# Altium footprint library BBC_Connectors.PcbLib: 141 footprints (part 6 of 9)
Each footprint in its own frame and in the unit in brackets; x right, y up, seen from the top. Pads: shape width x height; smd on the part's side, far side on the other; paste and mask are expansions set on the pad; w line width, h text height; cw(c..) or ccw(c..) is an arc to the next point about the centre after c.
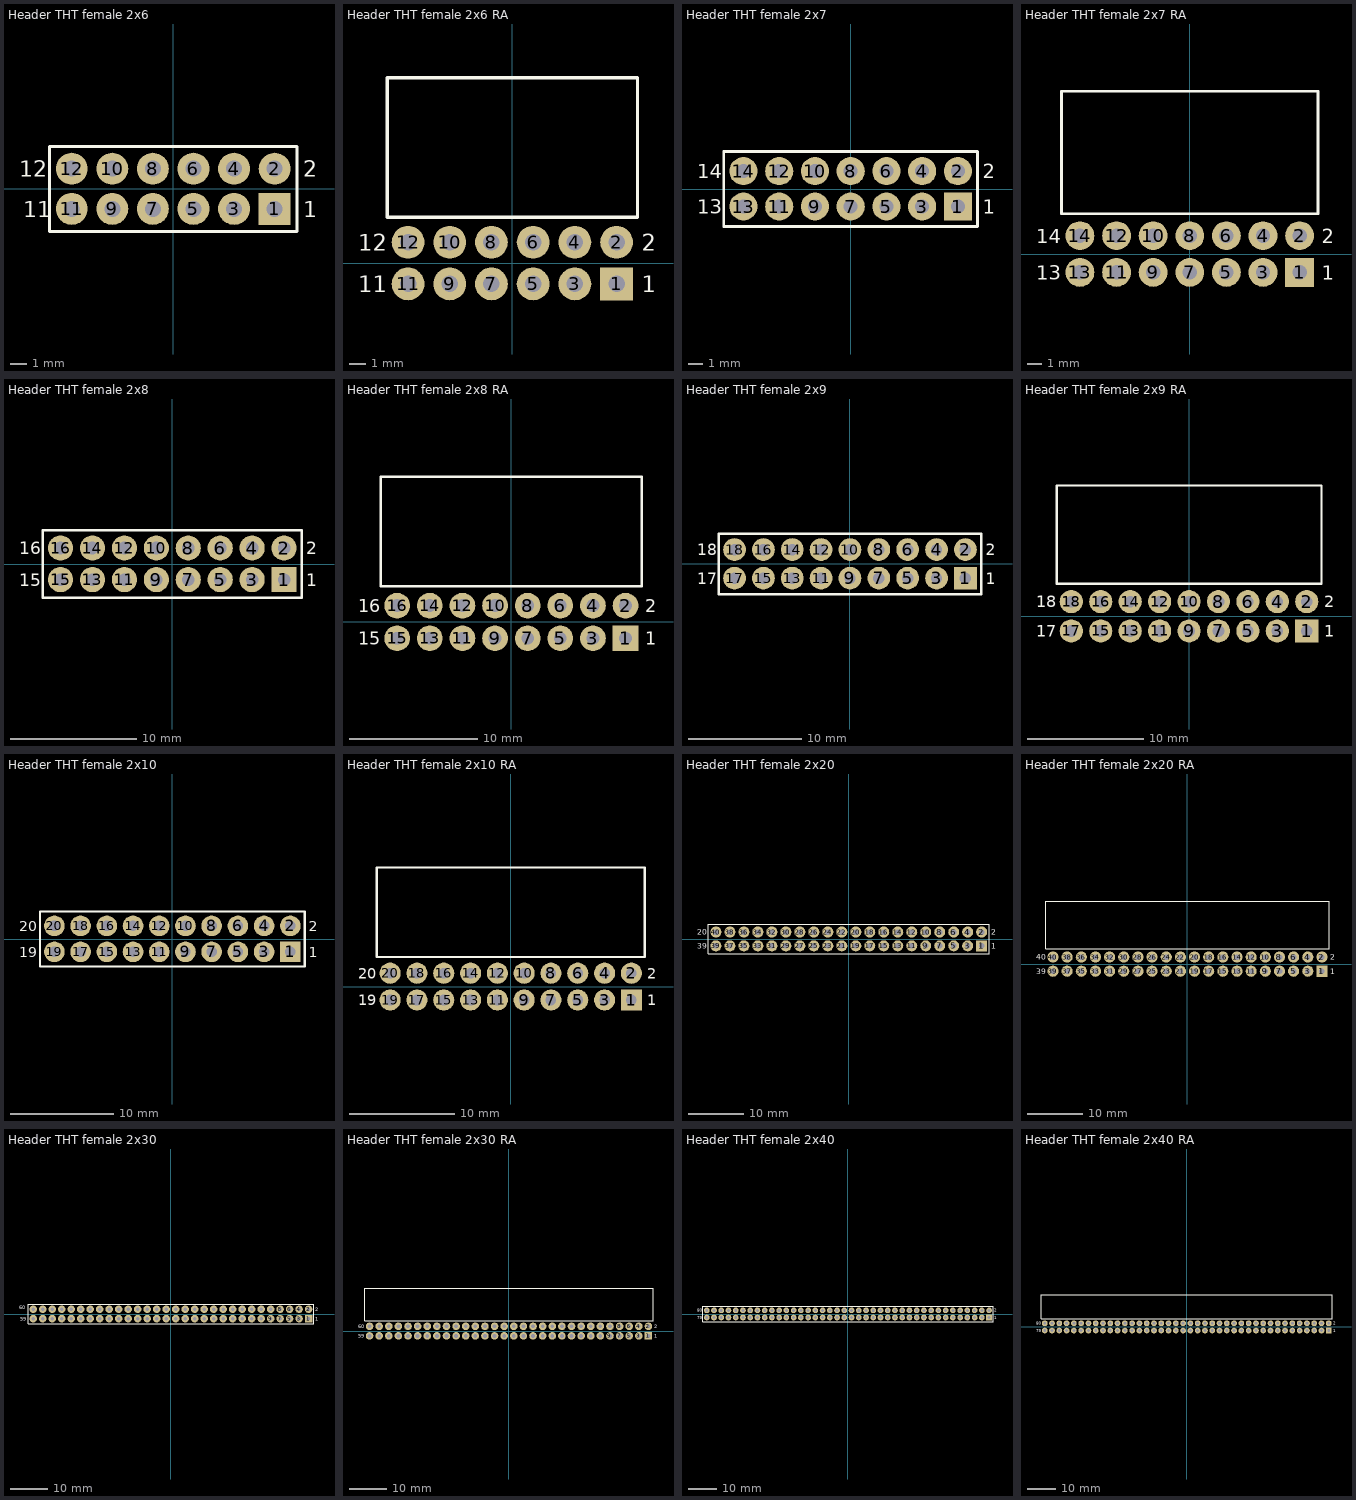
[diagram p5: the footprints below, top view; thin cyan lines are the x and y axes]

## Header THT female 2x6 [mm] "header for tht mounting / pitch = 2.54mm"
height 11
pads (12):
  rect 2x2 hole 1: 1(6.35,-1.245)
  round 2 hole 1: 2(6.35,1.27) 3(3.81,-1.245) 4(3.81,1.27) 5(1.27,-1.245) 6(1.27,1.27) 7(-1.27,-1.245) 8(-1.27,1.27) 9(-3.81,-1.245) 10(-3.81,1.27) 11(-6.35,-1.245) 12(-6.35,1.27)
Top Overlay:
  lines w0.2: -7.747,-2.667 -7.747,2.667 7.747,2.667 7.747,-2.667 -7.747,-2.667
  text "11" at -9.398,-1.77 h1
  text "1" at 8.128,-1.77 h1
  text "2" at 8.128,0.77 h1
  text "12" at -9.652,0.77 h1
3D body "Header THT female 2x6.step": height 8.5, standoff -3.2, extent -7.62,-2.54 7.62,2.54
3D body: height 2.51, standoff -3, extent 2.54,3.81 2.54,3.81

## Header THT female 2x6 RA [mm] "right angled header for tht mounting / pitch = 2.54mm"
height 6
pads (12):
  rect 2x2 hole 1: 1(6.35,-1.27)
  round 2 hole 1: 2(6.35,1.27) 3(3.81,-1.27) 4(3.81,1.27) 5(1.27,-1.27) 6(1.27,1.27) 7(-1.27,-1.27) 8(-1.27,1.27) 9(-3.81,-1.27) 10(-3.81,1.27) 11(-6.35,-1.27) 12(-6.35,1.27)
Top Overlay:
  lines w0.2: -7.62,2.794 -7.62,11.294 7.62,11.294 7.62,2.794 -7.62,2.794
  text "12" at -9.398,0.762 h1
  text "11" at -9.398,-1.778 h1
  text "2" at 7.874,0.762 h1
  text "1" at 7.874,-1.778 h1
3D body: height 2.51, standoff -3, extent 2.54,3.81 2.54,3.81
3D body "Header THT female 2x6 RA.step": height 4.94, standoff -3.2, extent -7.62,-1.596 7.62,11.294

## Header THT female 2x7 [mm] "header for tht mounting / pitch = 2.54mm"
height 11
pads (14):
  rect 2x2 hole 1: 1(7.62,-1.245)
  round 2 hole 1: 2(7.62,1.27) 3(5.08,-1.245) 4(5.08,1.27) 5(2.54,-1.245) 6(2.54,1.27) 7(0,-1.245) 8(0,1.27) 9(-2.54,-1.245) 10(-2.54,1.27) 11(-5.08,-1.245) 12(-5.08,1.27) 13(-7.62,-1.245) 14(-7.62,1.27)
Top Overlay:
  lines w0.2: -9.017,-2.667 9.017,-2.667 9.017,2.667 -9.017,2.667 -9.017,-2.667
  text "14" at -10.922,0.77 h1
  text "2" at 9.398,0.77 h1
  text "1" at 9.398,-1.77 h1
  text "13" at -10.922,-1.77 h1
3D body: height 2.51, standoff -3, extent 2.54,3.81 2.54,3.81
3D body "Header THT female 2x7.step": height 8.5, standoff -3.2, extent -8.89,-2.54 8.89,2.54

## Header THT female 2x7 RA [mm] "right angled header for tht mounting / pitch = 2.54mm"
height 6
pads (14):
  rect 2x2 hole 1: 1(7.62,-1.27)
  round 2 hole 1: 2(7.62,1.27) 3(5.08,-1.27) 4(5.08,1.27) 5(2.54,-1.27) 6(2.54,1.27) 7(0,-1.27) 8(0,1.27) 9(-2.54,-1.27) 10(-2.54,1.27) 11(-5.08,-1.27) 12(-5.08,1.27) 13(-7.62,-1.27) 14(-7.62,1.27)
Top Overlay:
  lines w0.2: -8.89,2.794 8.89,2.794 8.89,11.294 -8.89,11.294 -8.89,2.794
  text "13" at -10.668,-1.778 h1
  text "14" at -10.668,0.762 h1
  text "1" at 9.144,-1.778 h1
  text "2" at 9.144,0.762 h1
3D body "Header THT female 2x7 RA.step": height 4.94, standoff -3.2, extent -8.89,-1.596 8.89,11.294
3D body: height 2.51, standoff -3, extent 2.54,3.81 2.54,3.81

## Header THT female 2x8 [mm] "header for tht mounting / pitch = 2.54mm"
height 11
pads (16):
  rect 2x2 hole 1: 1(8.89,-1.245)
  round 2 hole 1: 2(8.89,1.27) 3(6.35,-1.245) 4(6.35,1.27) 5(3.81,-1.245) 6(3.81,1.27) 7(1.27,-1.245) 8(1.27,1.27) 9(-1.27,-1.245) 10(-1.27,1.27) 11(-3.81,-1.245) 12(-3.81,1.27) 13(-6.35,-1.245) 14(-6.35,1.27) 15(-8.89,-1.245) 16(-8.89,1.27)
Top Overlay:
  lines w0.2: -10.287,-2.667 10.287,-2.667 10.287,2.667 -10.287,2.667 -10.287,-2.667
  text "16" at -12.192,0.77 h1
  text "2" at 10.668,0.77 h1
  text "1" at 10.668,-1.77 h1
  text "15" at -12.192,-1.77 h1
3D body: height 2.51, standoff -3, extent 2.54,3.81 2.54,3.81
3D body "Header THT female 2x8.step": height 8.5, standoff -3.2, extent -10.16,-2.54 10.16,2.54

## Header THT female 2x8 RA [mm] "right angled header for tht mounting / pitch = 2.54mm"
height 6
pads (16):
  rect 2x2 hole 1: 1(8.89,-1.27)
  round 2 hole 1: 2(8.89,1.27) 3(6.35,-1.27) 4(6.35,1.27) 5(3.81,-1.27) 6(3.81,1.27) 7(1.27,-1.27) 8(1.27,1.27) 9(-1.27,-1.27) 10(-1.27,1.27) 11(-3.81,-1.27) 12(-3.81,1.27) 13(-6.35,-1.27) 14(-6.35,1.27) 15(-8.89,-1.27) 16(-8.89,1.27)
Top Overlay:
  lines w0.2: -10.16,2.794 10.16,2.794 10.16,11.294 -10.16,11.294 -10.16,2.794
  text "1" at 10.414,-1.778 h1
  text "2" at 10.414,0.762 h1
  text "15" at -11.938,-1.778 h1
  text "16" at -11.938,0.762 h1
3D body "Header THT female 2x8 RA.step": height 4.94, standoff -3.2, extent -10.16,-1.596 10.16,11.294
3D body: height 2.51, standoff -3, extent 2.54,3.81 2.54,3.81

## Header THT female 2x9 [mm] "header for tht mounting / pitch = 2.54mm"
height 11
pads (18):
  rect 2x2 hole 1: 1(10.16,-1.245)
  round 2 hole 1: 2(10.16,1.27) 3(7.62,-1.245) 4(7.62,1.27) 5(5.08,-1.245) 6(5.08,1.27) 7(2.54,-1.245) 8(2.54,1.27) 9(0,-1.245) 10(0,1.27) 11(-2.54,-1.245) 12(-2.54,1.27) 13(-5.08,-1.245) 14(-5.08,1.27) 15(-7.62,-1.245) 16(-7.62,1.27) 17(-10.16,-1.245) 18(-10.16,1.27)
Top Overlay:
  lines w0.2: -11.557,-2.667 -11.557,2.667 11.557,2.667 11.557,-2.667 -11.557,-2.667
  text "17" at -13.462,-1.77 h1
  text "1" at 11.938,-1.77 h1
  text "2" at 11.938,0.77 h1
  text "18" at -13.462,0.77 h1
3D body "Header THT female 2x9.step": height 8.5, standoff -3.2, extent -11.43,-2.54 11.43,2.54
3D body: height 2.51, standoff -3, extent 2.54,3.81 2.54,3.81

## Header THT female 2x9 RA [mm] "right angled header for tht mounting / pitch = 2.54mm"
height 6
pads (18):
  rect 2x2 hole 1: 1(10.16,-1.27)
  round 2 hole 1: 2(10.16,1.27) 3(7.62,-1.27) 4(7.62,1.27) 5(5.08,-1.27) 6(5.08,1.27) 7(2.54,-1.27) 8(2.54,1.27) 9(0,-1.27) 10(0,1.27) 11(-2.54,-1.27) 12(-2.54,1.27) 13(-5.08,-1.27) 14(-5.08,1.27) 15(-7.62,-1.27) 16(-7.62,1.27) 17(-10.16,-1.27) 18(-10.16,1.27)
Top Overlay:
  lines w0.2: -11.43,2.794 -11.43,11.294 11.43,11.294 11.43,2.794 -11.43,2.794
  text "2" at 11.684,0.762 h1
  text "1" at 11.684,-1.778 h1
  text "18" at -13.208,0.762 h1
  text "17" at -13.208,-1.778 h1
3D body "Header THT female 2x9 RA.step": height 4.94, standoff -3.2, extent -11.43,-1.596 11.43,11.294
3D body: height 2.51, standoff -3, extent 2.54,3.81 2.54,3.81

## Header THT female 2x10 [mm] "header for tht mounting / pitch = 2.54mm"
height 11
pads (20):
  rect 2x2 hole 1: 1(11.43,-1.245)
  round 2 hole 1: 2(11.43,1.27) 3(8.89,-1.245) 4(8.89,1.27) 5(6.35,-1.245) 6(6.35,1.27) 7(3.81,-1.245) 8(3.81,1.27) 9(1.27,-1.245) 10(1.27,1.27) 11(-1.27,-1.245) 12(-1.27,1.27) 13(-3.81,-1.245) 14(-3.81,1.27) 15(-6.35,-1.245) 16(-6.35,1.27) 17(-8.89,-1.245) 18(-8.89,1.27) 19(-11.43,-1.245) 20(-11.43,1.27)
Top Overlay:
  lines w0.2: -12.827,-2.667 12.827,-2.667 12.827,2.667 -12.827,2.667 -12.827,-2.667
  text "19" at -14.859,-1.77 h1
  text "1" at 13.208,-1.77 h1
  text "2" at 13.208,0.77 h1
  text "20" at -14.859,0.77 h1
3D body: height 2.51, standoff -3, extent 2.54,3.81 2.54,3.81
3D body "Header THT female 2x10.step": height 8.5, standoff -3.2, extent -12.7,-2.54 12.7,2.54

## Header THT female 2x10 RA [mm] "right angled header for tht mounting / pitch = 2.54mm"
height 6
pads (20):
  rect 2x2 hole 1: 1(11.43,-1.27)
  round 2 hole 1: 2(11.43,1.27) 3(8.89,-1.27) 4(8.89,1.27) 5(6.35,-1.27) 6(6.35,1.27) 7(3.81,-1.27) 8(3.81,1.27) 9(1.27,-1.27) 10(1.27,1.27) 11(-1.27,-1.27) 12(-1.27,1.27) 13(-3.81,-1.27) 14(-3.81,1.27) 15(-6.35,-1.27) 16(-6.35,1.27) 17(-8.89,-1.27) 18(-8.89,1.27) 19(-11.43,-1.27) 20(-11.43,1.27)
Top Overlay:
  lines w0.2: -12.7,2.794 -12.7,11.294 12.7,11.294 12.7,2.794 -12.7,2.794
  text "20" at -14.478,0.762 h1
  text "19" at -14.478,-1.778 h1
  text "2" at 12.954,0.762 h1
  text "1" at 12.954,-1.778 h1
3D body "Header THT female 2x10 RA.step": height 4.94, standoff -3.2, extent -12.7,-1.596 12.7,11.294
3D body: height 2.51, standoff -3, extent 2.54,3.81 2.54,3.81

## Header THT female 2x20 [mm] "header for tht mounting / pitch = 2.54mm"
height 11
pads (40):
  rect 2x2 hole 1: 1(24.13,-1.245)
  round 2 hole 1: 2(24.13,1.27) 3(21.59,-1.245) 4(21.59,1.27) 5(19.05,-1.245) 6(19.05,1.27) 7(16.51,-1.245) 8(16.51,1.27) 9(13.97,-1.245) 10(13.97,1.27) 11(11.43,-1.245) 12(11.43,1.27) 13(8.89,-1.245) 14(8.89,1.27) 15(6.35,-1.245) 16(6.35,1.27) 17(3.81,-1.245) 18(3.81,1.27) 19(1.27,-1.245) 20(1.27,1.27) 21(-1.27,-1.245) 22(-1.27,1.27) 23(-3.81,-1.245) 24(-3.81,1.27) 25(-6.35,-1.245) 26(-6.35,1.27) 27(-8.89,-1.245) 28(-8.89,1.27) 29(-11.43,-1.245) 30(-11.43,1.27) 31(-13.97,-1.245) 32(-13.97,1.27) 33(-16.51,-1.245) 34(-16.51,1.27) 35(-19.05,-1.245) 36(-19.05,1.27) 37(-21.59,-1.245) 38(-21.59,1.27) 39(-24.13,-1.245) 40(-24.13,1.27)
Top Overlay:
  lines w0.2: -25.527,-2.667 25.527,-2.667 25.527,2.667 -25.527,2.667 -25.527,-2.667
  text "20" at -27.559,0.77 h1
  text "2" at 25.908,0.77 h1
  text "1" at 25.908,-1.77 h1
  text "39" at -27.559,-1.77 h1
3D body "Header THT female 2x20.step": height 8.5, standoff -3.2, extent -25.4,-2.54 25.4,2.54
3D body: height 2.51, standoff -3, extent 2.54,3.81 2.54,3.81

## Header THT female 2x20 RA [mm] "right angled header for tht mounting / pitch = 2.54mm"
height 6
pads (40):
  rect 2x2 hole 1: 1(24.13,-1.27)
  round 2 hole 1: 2(24.13,1.27) 3(21.59,-1.27) 4(21.59,1.27) 5(19.05,-1.27) 6(19.05,1.27) 7(16.51,-1.27) 8(16.51,1.27) 9(13.97,-1.27) 10(13.97,1.27) 11(11.43,-1.27) 12(11.43,1.27) 13(8.89,-1.27) 14(8.89,1.27) 15(6.35,-1.27) 16(6.35,1.27) 17(3.81,-1.27) 18(3.81,1.27) 19(1.27,-1.27) 20(1.27,1.27) 21(-1.27,-1.27) 22(-1.27,1.27) 23(-3.81,-1.27) 24(-3.81,1.27) 25(-6.35,-1.27) 26(-6.35,1.27) 27(-8.89,-1.27) 28(-8.89,1.27) 29(-11.43,-1.27) 30(-11.43,1.27) 31(-13.97,-1.27) 32(-13.97,1.27) 33(-16.51,-1.27) 34(-16.51,1.27) 35(-19.05,-1.27) 36(-19.05,1.27) 37(-21.59,-1.27) 38(-21.59,1.27) 39(-24.13,-1.27) 40(-24.13,1.27)
Top Overlay:
  lines w0.2: -25.4,2.794 -25.4,11.294 25.4,11.294 25.4,2.794 -25.4,2.794
  text "40" at -27.178,0.762 h1
  text "39" at -27.178,-1.778 h1
  text "2" at 25.654,0.762 h1
  text "1" at 25.654,-1.778 h1
3D body: height 2.51, standoff -3, extent 2.54,3.81 2.54,3.81
3D body "Header THT female 2x20 RA.step": height 4.94, standoff -3.2, extent -25.4,-1.596 25.4,11.294

## Header THT female 2x30 [mm] "header for tht mounting / pitch = 2.54mm"
height 11
pads (60):
  rect 2x2 hole 1: 1(36.83,-1.245)
  round 2 hole 1: 2(36.83,1.27) 3(34.29,-1.245) 4(34.29,1.27) 5(31.75,-1.245) 6(31.75,1.27) 7(29.21,-1.245) 8(29.21,1.27) 9(26.67,-1.245) 10(26.67,1.27) 11(24.13,-1.245) 12(24.13,1.27) 13(21.59,-1.245) 14(21.59,1.27) 15(19.05,-1.245) 16(19.05,1.27) 17(16.51,-1.245) 18(16.51,1.27) 19(13.97,-1.245) 20(13.97,1.27) 21(11.43,-1.245) 22(11.43,1.27) 23(8.89,-1.245) 24(8.89,1.27) 25(6.35,-1.245) 26(6.35,1.27) 27(3.81,-1.245) 28(3.81,1.27) 29(1.27,-1.245) 30(1.27,1.27) 31(-1.27,-1.245) 32(-1.27,1.27) 33(-3.81,-1.245) 34(-3.81,1.27) 35(-6.35,-1.245) 36(-6.35,1.27) 37(-8.89,-1.245) 38(-8.89,1.27) 39(-11.43,-1.245) 40(-11.43,1.27) 41(-13.97,-1.245) 42(-13.97,1.27) 43(-16.51,-1.245) 44(-16.51,1.27) 45(-19.05,-1.245) 46(-19.05,1.27) 47(-21.59,-1.245) 48(-21.59,1.27) 49(-24.13,-1.245) 50(-24.13,1.27) 51(-26.67,-1.245) 52(-26.67,1.27) 53(-29.21,-1.245) 54(-29.21,1.27) 55(-31.75,-1.245) 56(-31.75,1.27) 57(-34.29,-1.245) 58(-34.29,1.27) 59(-36.83,-1.245) 60(-36.83,1.27)
Top Overlay:
  lines w0.2: -38.227,-2.667 38.227,-2.667 38.227,2.667 -38.227,2.667 -38.227,-2.667
  text "59" at -40.259,-1.77 h1
  text "1" at 38.608,-1.77 h1
  text "2" at 38.608,0.77 h1
  text "60" at -40.64,1.27 h1
3D body: height 2.51, standoff -3, extent 2.54,3.81 2.54,3.81
3D body "Header THT female 2x30.step": height 8.5, standoff -3.2, extent -38.1,-2.54 38.1,2.54

## Header THT female 2x30 RA [mm] "right angled header for tht mounting / pitch = 2.54mm"
height 6
pads (60):
  rect 2x2 hole 1: 1(36.83,-1.27)
  round 2 hole 1: 2(36.83,1.27) 3(34.29,-1.27) 4(34.29,1.27) 5(31.75,-1.27) 6(31.75,1.27) 7(29.21,-1.27) 8(29.21,1.27) 9(26.67,-1.27) 10(26.67,1.27) 11(24.13,-1.27) 12(24.13,1.27) 13(21.59,-1.27) 14(21.59,1.27) 15(19.05,-1.27) 16(19.05,1.27) 17(16.51,-1.27) 18(16.51,1.27) 19(13.97,-1.27) 20(13.97,1.27) 21(11.43,-1.27) 22(11.43,1.27) 23(8.89,-1.27) 24(8.89,1.27) 25(6.35,-1.27) 26(6.35,1.27) 27(3.81,-1.27) 28(3.81,1.27) 29(1.27,-1.27) 30(1.27,1.27) 31(-1.27,-1.27) 32(-1.27,1.27) 33(-3.81,-1.27) 34(-3.81,1.27) 35(-6.35,-1.27) 36(-6.35,1.27) 37(-8.89,-1.27) 38(-8.89,1.27) 39(-11.43,-1.27) 40(-11.43,1.27) 41(-13.97,-1.27) 42(-13.97,1.27) 43(-16.51,-1.27) 44(-16.51,1.27) 45(-19.05,-1.27) 46(-19.05,1.27) 47(-21.59,-1.27) 48(-21.59,1.27) 49(-24.13,-1.27) 50(-24.13,1.27) 51(-26.67,-1.27) 52(-26.67,1.27) 53(-29.21,-1.27) 54(-29.21,1.27) 55(-31.75,-1.27) 56(-31.75,1.27) 57(-34.29,-1.27) 58(-34.29,1.27) 59(-36.83,-1.27) 60(-36.83,1.27)
Top Overlay:
  lines w0.2: -38.1,2.794 -38.1,11.294 38.1,11.294 38.1,2.794 -38.1,2.794
  text "60" at -39.878,0.762 h1
  text "59" at -39.878,-1.778 h1
  text "2" at 38.354,0.762 h1
  text "1" at 38.354,-1.778 h1
3D body "Header THT female 2x30 RA.step": height 4.94, standoff -3.2, extent -38.1,-1.596 38.1,11.294
3D body: height 2.51, standoff -3, extent 2.54,3.81 2.54,3.81

## Header THT female 2x40 [mm] "header for tht mounting / pitch = 2.54mm"
height 11
pads (80):
  rect 2x2 hole 1: 1(49.53,-1.245)
  round 2 hole 1: 2(49.53,1.27) 3(46.99,-1.245) 4(46.99,1.27) 5(44.45,-1.245) 6(44.45,1.27) 7(41.91,-1.245) 8(41.91,1.27) 9(39.37,-1.245) 10(39.37,1.27) 11(36.83,-1.245) 12(36.83,1.27) 13(34.29,-1.245) 14(34.29,1.27) 15(31.75,-1.245) 16(31.75,1.27) 17(29.21,-1.245) 18(29.21,1.27) 19(26.67,-1.245) 20(26.67,1.27) 21(24.13,-1.245) 22(24.13,1.27) 23(21.59,-1.245) 24(21.59,1.27) 25(19.05,-1.245) 26(19.05,1.27) 27(16.51,-1.245) 28(16.51,1.27) 29(13.97,-1.245) 30(13.97,1.27) 31(11.43,-1.245) 32(11.43,1.27) 33(8.89,-1.245) 34(8.89,1.27) 35(6.35,-1.245) 36(6.35,1.27) 37(3.81,-1.245) 38(3.81,1.27) 39(1.27,-1.245) 40(1.27,1.27) 41(-1.27,-1.245) 42(-1.27,1.27) 43(-3.81,-1.245) 44(-3.81,1.27) 45(-6.35,-1.245) 46(-6.35,1.27) 47(-8.89,-1.245) 48(-8.89,1.27) 49(-11.43,-1.245) 50(-11.43,1.27) 51(-13.97,-1.245) 52(-13.97,1.27) 53(-16.51,-1.245) 54(-16.51,1.27) 55(-19.05,-1.245) 56(-19.05,1.27) 57(-21.59,-1.245) 58(-21.59,1.27) 59(-24.13,-1.245) 60(-24.13,1.27) 61(-26.67,-1.245) 62(-26.67,1.27) 63(-29.21,-1.245) 64(-29.21,1.27) 65(-31.75,-1.245) 66(-31.75,1.27) 67(-34.29,-1.245) 68(-34.29,1.27) 69(-36.83,-1.245) 70(-36.83,1.27) 71(-39.37,-1.245) 72(-39.37,1.27) 73(-41.91,-1.245) 74(-41.91,1.27) 75(-44.45,-1.245) 76(-44.45,1.27) 77(-46.99,-1.245) 78(-46.99,1.27) 79(-49.53,-1.245) 80(-49.53,1.27)
Top Overlay:
  lines w0.2: 50.927,2.667 -50.927,2.667 -50.927,-2.667 50.927,-2.667 50.927,2.667 ; 50.927,2.667 50.927,2.667
  text "79" at -52.959,-1.77 h1
  text "1" at 51.308,-1.77 h1
  text "2" at 51.308,0.77 h1
  text "80" at -52.959,0.77 h1
3D body: height 2.51, standoff -3, extent 2.54,3.81 2.54,3.81
3D body "Header THT female 2x40.step": height 8.5, standoff -3.2, extent -50.8,-2.54 50.8,2.54

## Header THT female 2x40 RA [mm] "right angled header for tht mounting / pitch = 2.54mm"
height 6
pads (80):
  rect 2x2 hole 1: 1(49.53,-1.27)
  round 2 hole 1: 2(49.53,1.27) 3(46.99,-1.27) 4(46.99,1.27) 5(44.45,-1.27) 6(44.45,1.27) 7(41.91,-1.27) 8(41.91,1.27) 9(39.37,-1.27) 10(39.37,1.27) 11(36.83,-1.27) 12(36.83,1.27) 13(34.29,-1.27) 14(34.29,1.27) 15(31.75,-1.27) 16(31.75,1.27) 17(29.21,-1.27) 18(29.21,1.27) 19(26.67,-1.27) 20(26.67,1.27) 21(24.13,-1.27) 22(24.13,1.27) 23(21.59,-1.27) 24(21.59,1.27) 25(19.05,-1.27) 26(19.05,1.27) 27(16.51,-1.27) 28(16.51,1.27) 29(13.97,-1.27) 30(13.97,1.27) 31(11.43,-1.27) 32(11.43,1.27) 33(8.89,-1.27) 34(8.89,1.27) 35(6.35,-1.27) 36(6.35,1.27) 37(3.81,-1.27) 38(3.81,1.27) 39(1.27,-1.27) 40(1.27,1.27) 41(-1.27,-1.27) 42(-1.27,1.27) 43(-3.81,-1.27) 44(-3.81,1.27) 45(-6.35,-1.27) 46(-6.35,1.27) 47(-8.89,-1.27) 48(-8.89,1.27) 49(-11.43,-1.27) 50(-11.43,1.27) 51(-13.97,-1.27) 52(-13.97,1.27) 53(-16.51,-1.27) 54(-16.51,1.27) 55(-19.05,-1.27) 56(-19.05,1.27) 57(-21.59,-1.27) 58(-21.59,1.27) 59(-24.13,-1.27) 60(-24.13,1.27) 61(-26.67,-1.27) 62(-26.67,1.27) 63(-29.21,-1.27) 64(-29.21,1.27) 65(-31.75,-1.27) 66(-31.75,1.27) 67(-34.29,-1.27) 68(-34.29,1.27) 69(-36.83,-1.27) 70(-36.83,1.27) 71(-39.37,-1.27) 72(-39.37,1.27) 73(-41.91,-1.27) 74(-41.91,1.27) 75(-44.45,-1.27) 76(-44.45,1.27) 77(-46.99,-1.27) 78(-46.99,1.27) 79(-49.53,-1.27) 80(-49.53,1.27)
Top Overlay:
  lines w0.2: -50.8,2.794 -50.8,11.294 50.8,11.294 50.8,2.794 -50.8,2.794
  text "80" at -52.578,0.762 h1
  text "79" at -52.578,-1.778 h1
  text "2" at 51.054,0.762 h1
  text "1" at 51.054,-1.778 h1
3D body: height 2.51, standoff -3, extent 2.54,3.81 2.54,3.81
3D body "Header THT female 2x40 RA.step": height 4.94, standoff -3.2, extent -50.8,-1.596 50.8,11.294